# Altium footprint library Toi Library.PcbLib: 740 footprints (part 17 of 47)
Each footprint in its own frame and in the unit in brackets; x right, y up, seen from the top. Pads: shape width x height; smd on the part's side, far side on the other; paste and mask are expansions set on the pad; w line width, h text height; cw(c..) or ccw(c..) is an arc to the next point about the centre after c.
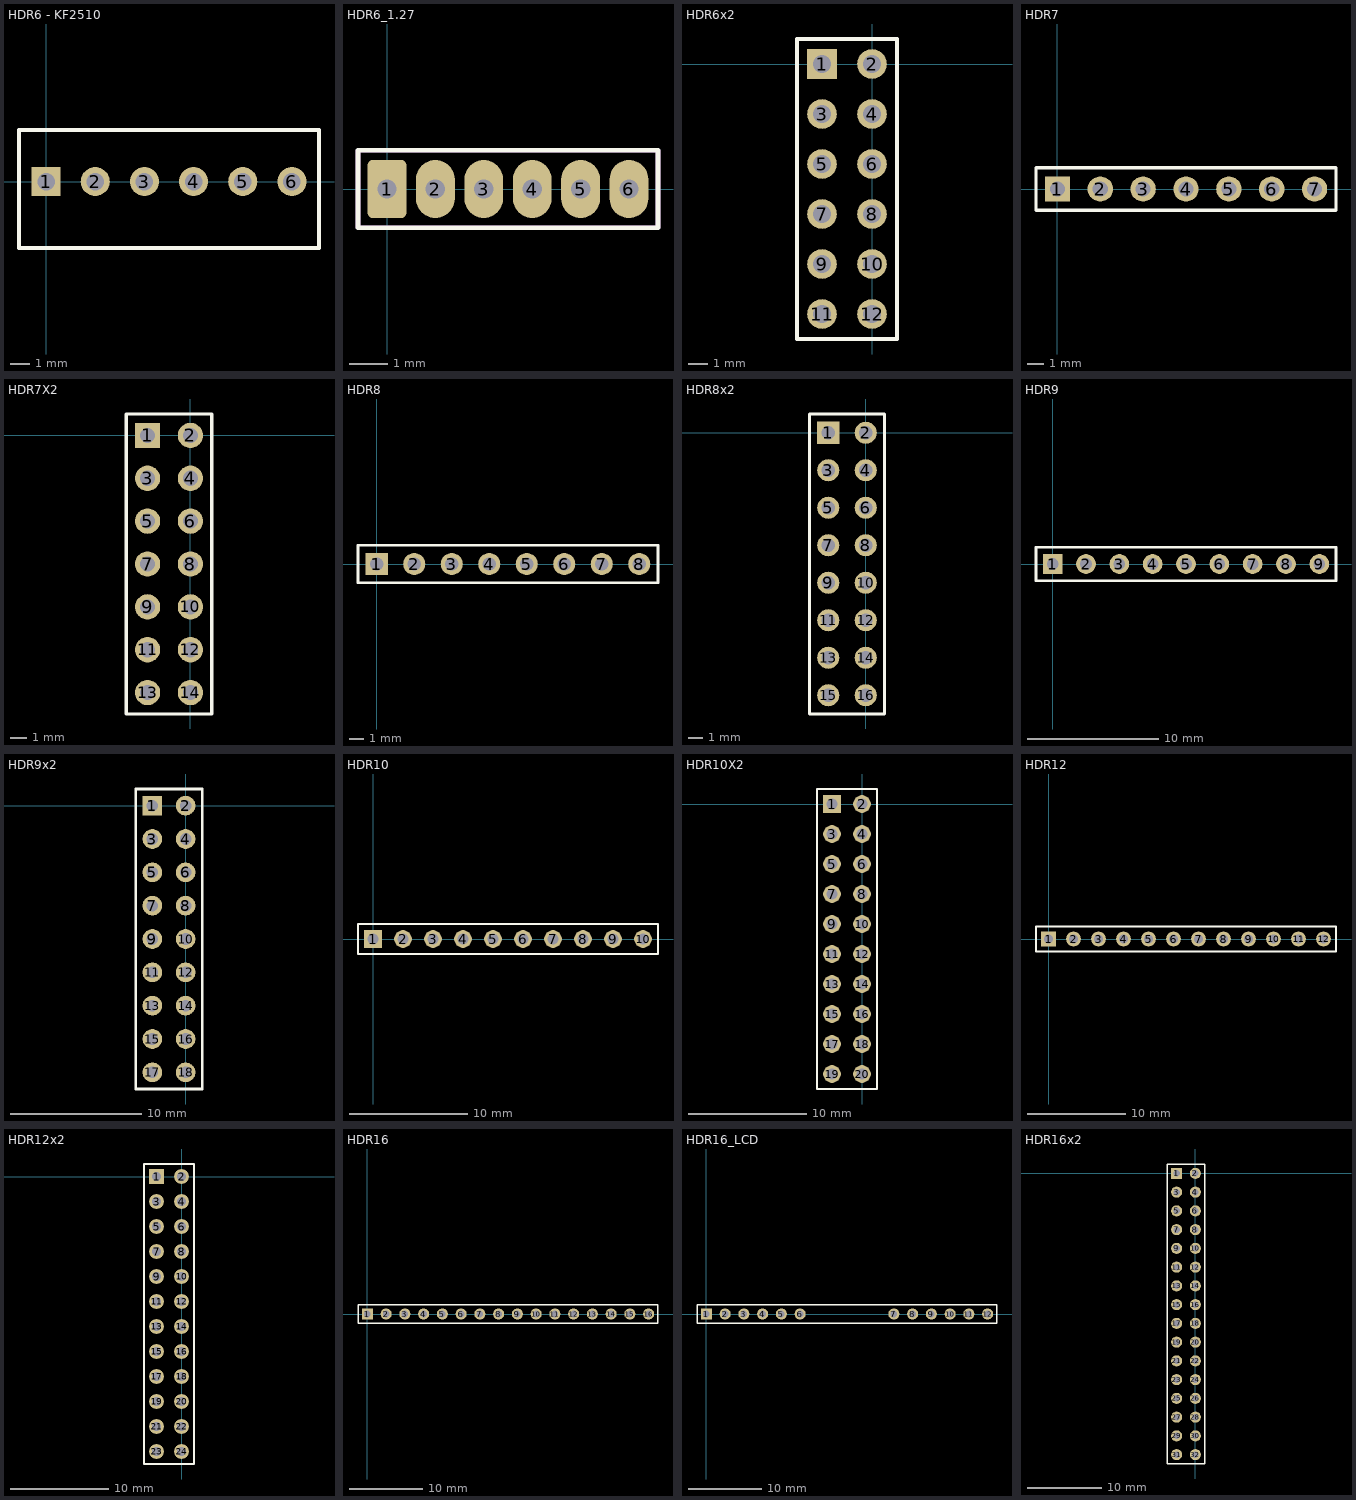
[diagram p16: the footprints below, top view; thin cyan lines are the x and y axes]

## HDR6 - KF2510 [mm] "Connector; Header; 6 Position"
height 1.14
pads (6):
  rect 1.5x1.5 hole 0.9: 1(0,0)
  round 1.5 hole 0.9: 2(2.54,0) 3(5.08,0) 4(7.62,0) 5(10.16,0) 6(12.7,0)
Top Overlay:
  lines w0.2: -1.397,-3.429 -1.397,2.667 14.097,2.667 14.097,-3.429 -1.397,-3.429
3D body "User Library-CI31_6.STEP": height 10.53, standoff -4.27, extent -1.27,-3.279 13.97,2.521

## HDR6_1.27 [mil] "Connector; Header; 6 Position, 0.050\" pitch"
pads (6):
  rrect25% 40x60 hole 20: 1(0,0)
  oval 40x60 hole 20: 2(50,0) 3(100,0) 4(150,0) 5(200,0) 6(250,0)
Top Overlay:
  lines w5: -30,-40 -30,40 280,40 280,-40 -30,-40
Bottom Solder:
  rectangle: 0,-30 250,30
Mechanical 13:
  lines w5: -30,-40 -30,40 280,40 280,-40 -30,-40

## HDR6x2 [mm] "Connector; Header; 3x2 Position"
height 1.14
pads (12):
  rect 1.5x1.5 hole 0.9: 1(-2.54,0)
  round 1.5 hole 0.9: 2(0,0) 3(-2.54,-2.54) 4(0,-2.54) 5(-2.54,-5.08) 6(0,-5.08) 7(-2.54,-7.62) 8(0,-7.62) 9(-2.54,-10.16) 10(0,-10.16) 11(-2.54,-12.7) 12(0,-12.7)
Top Overlay:
  lines w0.2: -3.81,-13.97 1.27,-13.97 1.27,1.27 -3.81,1.27 -3.81,-13.97
3D body "User Library-Header1x2.STEP": height 1.39, standoff -9.59, extent -3.81,-13.97 1.27,-11.43
3D body "User Library-Header1x2.STEP": height 1.39, standoff -9.59, extent -3.81,-8.89 1.27,-6.35
3D body "User Library-Header1x2.STEP": height 1.39, standoff -9.59, extent -3.81,-6.35 1.27,-3.81
3D body "User Library-Header1x2.STEP": height 1.39, standoff -9.59, extent -3.81,-3.81 1.27,-1.27
3D body "User Library-Header1x2.STEP": height 1.39, standoff -9.59, extent -3.81,-1.27 1.27,1.27
3D body "User Library-Header1x2.STEP": height 1.39, standoff -9.59, extent -3.81,-11.43 1.27,-8.89

## HDR7 [mm] "Connector; Header; 7 Position"
height 1.14
pads (7):
  rect 1.5x1.5 hole 0.9: 1(0,0)
  round 1.5 hole 0.9: 2(2.54,0) 3(5.08,0) 4(7.62,0) 5(10.16,0) 6(12.7,0) 7(15.24,0)
Top Overlay:
  lines w0.2: -1.27,-1.27 -1.27,1.27 16.51,1.27 16.51,-1.27 -1.27,-1.27
3D body "female_header_a-bl254-eg-g07d.stp": height 8.52, standoff -3.18, extent -1.42,-1.25 16.61,1.25

## HDR7X2 [mm]
pads (14):
  rect 1.5x1.5 hole 0.9: 1(-2.54,0)
  round 1.5 hole 0.9: 2(0,0) 3(-2.54,-2.54) 4(0,-2.54) 5(-2.54,-5.08) 6(0,-5.08) 7(-2.54,-7.62) 8(0,-7.62) 9(-2.54,-10.16) 10(0,-10.16) 11(-2.54,-12.7) 12(0,-12.7) 13(-2.54,-15.24) 14(0,-15.24)
Top Overlay:
  lines w0.2: -3.81,-16.51 1.27,-16.51 1.27,1.27 -3.81,1.27 -3.81,-16.51
3D body "User Library-Header1x2.STEP": height 1.39, standoff -9.59, extent -3.81,-13.97 1.27,-11.43
3D body "User Library-Header1x2.STEP": height 1.39, standoff -9.59, extent -3.81,-8.89 1.27,-6.35
3D body "User Library-Header1x2.STEP": height 1.39, standoff -9.59, extent -3.81,-6.35 1.27,-3.81
3D body "User Library-Header1x2.STEP": height 1.39, standoff -9.59, extent -3.81,-3.81 1.27,-1.27
3D body "User Library-Header1x2.STEP": height 1.39, standoff -9.59, extent -3.81,-1.27 1.27,1.27
3D body "User Library-Header1x2.STEP": height 1.39, standoff -9.59, extent -3.81,-11.43 1.27,-8.89
3D body "User Library-Header1x2.STEP": height 1.39, standoff -9.59, extent -3.81,-16.51 1.27,-13.97

## HDR8 [mm] "Connector; Header; 8 Position"
height 1.14
pads (8):
  rect 1.5x1.5 hole 0.9: 1(0,0)
  round 1.5 hole 0.9: 2(2.54,0) 3(5.08,0) 4(7.62,0) 5(10.16,0) 6(12.7,0) 7(15.24,0) 8(17.78,0)
Top Overlay:
  lines w0.2: -1.27,-1.27 19.05,-1.27 19.05,1.27 -1.27,1.27 -1.27,-1.27
3D body "female_header_a-bl254-eg-g08d.stp": height 7.92, standoff -3.78, extent -1.395,-1.257 19.175,1.243

## HDR8x2 [mm] "Connector; Header; 3x2 Position"
height 1.14
pads (16):
  rect 1.5x1.5 hole 0.9: 1(-2.54,0)
  round 1.5 hole 0.9: 2(0,0) 3(-2.54,-2.54) 4(0,-2.54) 5(-2.54,-5.08) 6(0,-5.08) 7(-2.54,-7.62) 8(0,-7.62) 9(-2.54,-10.16) 10(0,-10.16) 11(-2.54,-12.7) 12(0,-12.7) 13(-2.54,-15.24) 14(0,-15.24) 15(-2.54,-17.78) 16(0,-17.78)
Top Overlay:
  lines w0.2: -3.81,-19.05 1.27,-19.05 1.27,1.27 -3.81,1.27 -3.81,-19.05
3D body "User Library-Header1x2.STEP": height 1.39, standoff -9.59, extent -3.81,-19.05 1.27,-16.51
3D body "User Library-Header1x2.STEP": height 1.39, standoff -9.59, extent -3.81,-13.97 1.27,-11.43
3D body "User Library-Header1x2.STEP": height 1.39, standoff -9.59, extent -3.81,-8.89 1.27,-6.35
3D body "User Library-Header1x2.STEP": height 1.39, standoff -9.59, extent -3.81,-6.35 1.27,-3.81
3D body "User Library-Header1x2.STEP": height 1.39, standoff -9.59, extent -3.81,-3.81 1.27,-1.27
3D body "User Library-Header1x2.STEP": height 1.39, standoff -9.59, extent -3.81,-1.27 1.27,1.27
3D body "User Library-Header1x2.STEP": height 1.39, standoff -9.59, extent -3.81,-11.43 1.27,-8.89
3D body "User Library-Header1x2.STEP": height 1.39, standoff -9.59, extent -3.81,-16.51 1.27,-13.97

## HDR9 [mm] "Connector; Header; 9 Position"
height 1.14
pads (9):
  rect 1.5x1.5 hole 0.9: 1(0,0)
  round 1.5 hole 0.9: 2(2.54,0) 3(5.08,0) 4(7.62,0) 5(10.16,0) 6(12.7,0) 7(15.24,0) 8(17.78,0) 9(20.32,0)
Top Overlay:
  lines w0.2: -1.27,-1.27 -1.27,1.27 21.59,1.27 21.59,-1.27 -1.27,-1.27
3D body "female_header_a-bl254-eg-g09d.stp": height 7.92, standoff -3.78, extent -1.382,-1.255 21.728,1.245

## HDR9x2 [mm] "Connector; Header; 3x2 Position"
height 1.14
pads (18):
  rect 1.5x1.5 hole 0.9: 1(-2.54,0)
  round 1.5 hole 0.9: 2(0,0) 3(-2.54,-2.54) 4(0,-2.54) 5(-2.54,-5.08) 6(0,-5.08) 7(-2.54,-7.62) 8(0,-7.62) 9(-2.54,-10.16) 10(0,-10.16) 11(-2.54,-12.7) 12(0,-12.7) 13(-2.54,-15.24) 14(0,-15.24) 15(-2.54,-17.78) 16(0,-17.78) 17(-2.54,-20.32) 18(0,-20.32)
Top Overlay:
  lines w0.2: -3.81,-21.59 -3.81,1.27 1.27,1.27 1.27,-21.59 -3.81,-21.59
3D body "User Library-Header1x2.STEP": height 1.39, standoff -9.59, extent -3.81,-21.59 1.27,-19.05
3D body "User Library-Header1x2.STEP": height 1.39, standoff -9.59, extent -3.81,-16.51 1.27,-13.97
3D body "User Library-Header1x2.STEP": height 1.39, standoff -9.59, extent -3.81,-11.43 1.27,-8.89
3D body "User Library-Header1x2.STEP": height 1.39, standoff -9.59, extent -3.81,-1.27 1.27,1.27
3D body "User Library-Header1x2.STEP": height 1.39, standoff -9.59, extent -3.81,-3.81 1.27,-1.27
3D body "User Library-Header1x2.STEP": height 1.39, standoff -9.59, extent -3.81,-6.35 1.27,-3.81
3D body "User Library-Header1x2.STEP": height 1.39, standoff -9.59, extent -3.81,-8.89 1.27,-6.35
3D body "User Library-Header1x2.STEP": height 1.39, standoff -9.59, extent -3.81,-13.97 1.27,-11.43
3D body "User Library-Header1x2.STEP": height 1.39, standoff -9.59, extent -3.81,-19.05 1.27,-16.51

## HDR10 [mm] "Connector; Header; 10 Position"
height 1.14
pads (10):
  rect 1.5x1.5 hole 0.9: 1(0,0)
  round 1.5 hole 0.9: 2(2.54,0) 3(5.08,0) 4(7.62,0) 5(10.16,0) 6(12.7,0) 7(15.24,0) 8(17.78,0) 9(20.32,0) 10(22.86,0)
Top Overlay:
  lines w0.2: -1.27,-1.27 -1.27,1.27 0.635,1.27 24.13,1.27 24.13,-1.27 -1.27,-1.27
3D body "female_header_a-bl254-eg-g10d.stp": height 7.92, standoff -3.78, extent -1.408,-1.25 24.242,1.25

## HDR10X2 [mm] "Connector; Header; 10x2 Position"
pads (20):
  rect 1.5x1.5 hole 0.9: 1(-2.54,0)
  round 1.5 hole 0.9: 2(0,0) 3(-2.54,-2.54) 4(0,-2.54) 5(-2.54,-5.08) 6(0,-5.08) 7(-2.54,-7.62) 8(0,-7.62) 9(-2.54,-10.16) 10(0,-10.16) 11(-2.54,-12.7) 12(0,-12.7) 13(-2.54,-15.24) 14(0,-15.24) 15(-2.54,-17.78) 16(0,-17.78) 17(-2.54,-20.32) 18(0,-20.32) 19(-2.54,-22.86) 20(0,-22.86)
Top Overlay:
  lines w0.2: -3.81,-24.13 -3.81,1.27 1.27,1.27 1.27,-24.13 -3.81,-24.13
3D body "User Library-Header1x2.STEP": height 1.39, standoff -9.59, extent -3.81,-21.59 1.27,-19.05
3D body "User Library-Header1x2.STEP": height 1.39, standoff -9.59, extent -3.81,-16.51 1.27,-13.97
3D body "User Library-Header1x2.STEP": height 1.39, standoff -9.59, extent -3.81,-11.43 1.27,-8.89
3D body "User Library-Header1x2.STEP": height 1.39, standoff -9.59, extent -3.81,-1.27 1.27,1.27
3D body "User Library-Header1x2.STEP": height 1.39, standoff -9.59, extent -3.81,-3.81 1.27,-1.27
3D body "User Library-Header1x2.STEP": height 1.39, standoff -9.59, extent -3.81,-6.35 1.27,-3.81
3D body "User Library-Header1x2.STEP": height 1.39, standoff -9.59, extent -3.81,-8.89 1.27,-6.35
3D body "User Library-Header1x2.STEP": height 1.39, standoff -9.59, extent -3.81,-13.97 1.27,-11.43
3D body "User Library-Header1x2.STEP": height 1.39, standoff -9.59, extent -3.81,-19.05 1.27,-16.51
3D body "User Library-Header1x2.STEP": height 1.39, standoff -9.59, extent -3.81,-24.13 1.27,-21.59

## HDR12 [mm] "Connector; Header; 12 Position"
height 1.14
pads (12):
  rect 1.5x1.5 hole 0.9: 1(0,0)
  round 1.5 hole 0.9: 2(2.54,0) 3(5.08,0) 4(7.62,0) 5(10.16,0) 6(12.7,0) 7(15.24,0) 8(17.78,0) 9(20.32,0) 10(22.86,0) 11(25.4,0) 12(27.94,0)
Top Overlay:
  lines w0.2: -1.27,-1.27 29.21,-1.27 29.21,1.27 0.635,1.27 -1.27,1.27 -1.27,-1.27
3D body "female_header_a-bl254-eg-g12d.stp": height 8.52, standoff -3.18, extent -1.382,-1.255 29.348,1.245

## HDR12x2 [mm] "Connector; Header; 3x2 Position"
height 1.14
pads (24):
  rect 1.5x1.5 hole 0.9: 1(-2.54,0)
  round 1.5 hole 0.9: 2(0,0) 3(-2.54,-2.54) 4(0,-2.54) 5(-2.54,-5.08) 6(0,-5.08) 7(-2.54,-7.62) 8(0,-7.62) 9(-2.54,-10.16) 10(0,-10.16) 11(-2.54,-12.7) 12(0,-12.7) 13(-2.54,-15.24) 14(0,-15.24) 15(-2.54,-17.78) 16(0,-17.78) 17(-2.54,-20.32) 18(0,-20.32) 19(-2.54,-22.86) 20(0,-22.86) 21(-2.54,-25.4) 22(0,-25.4) 23(-2.54,-27.94) 24(0,-27.94)
Top Overlay:
  lines w0.2: -3.81,-29.21 -3.81,1.27 1.27,1.27 1.27,-29.21 -3.81,-29.21
3D body "User Library-Header1x2.STEP": height 1.39, standoff -9.59, extent -3.81,-21.59 1.27,-19.05
3D body "User Library-Header1x2.STEP": height 1.39, standoff -9.59, extent -3.81,-16.51 1.27,-13.97
3D body "User Library-Header1x2.STEP": height 1.39, standoff -9.59, extent -3.81,-11.43 1.27,-8.89
3D body "User Library-Header1x2.STEP": height 1.39, standoff -9.59, extent -3.81,-1.27 1.27,1.27
3D body "User Library-Header1x2.STEP": height 1.39, standoff -9.59, extent -3.81,-3.81 1.27,-1.27
3D body "User Library-Header1x2.STEP": height 1.39, standoff -9.59, extent -3.81,-6.35 1.27,-3.81
3D body "User Library-Header1x2.STEP": height 1.39, standoff -9.59, extent -3.81,-8.89 1.27,-6.35
3D body "User Library-Header1x2.STEP": height 1.39, standoff -9.59, extent -3.81,-13.97 1.27,-11.43
3D body "User Library-Header1x2.STEP": height 1.39, standoff -9.59, extent -3.81,-19.05 1.27,-16.51
3D body "User Library-Header1x2.STEP": height 1.39, standoff -9.59, extent -3.81,-24.13 1.27,-21.59
3D body "User Library-Header1x2.STEP": height 1.39, standoff -9.59, extent -3.81,-26.67 1.27,-24.13
3D body "User Library-Header1x2.STEP": height 1.39, standoff -9.59, extent -3.81,-29.21 1.27,-26.67

## HDR16 [mm] "Connector; Header; 16 Position"
height 1.14
pads (16):
  rect 1.5x1.5 hole 0.9: 1(0,0)
  round 1.5 hole 0.9: 2(2.54,0) 3(5.08,0) 4(7.62,0) 5(10.16,0) 6(12.7,0) 7(15.24,0) 8(17.78,0) 9(20.32,0) 10(22.86,0) 11(25.4,0) 12(27.94,0) 13(30.48,0) 14(33.02,0) 15(35.56,0) 16(38.1,0)
Top Overlay:
  lines w0.2: -1.27,-1.27 39.37,-1.27 39.37,1.27 0.635,1.27 -1.27,1.27 -1.27,-1.27
3D body "female_header_a-bl254-eg-g16d.stp": height 7.92, standoff -3.78, extent -1.408,-1.255 39.482,1.245

## HDR16_LCD [mm] "Connector; Header; 16 Position"
height 1.14
pads (12):
  rect 1.5x1.5 hole 0.9: 1(0,0)
  round 1.5 hole 0.9: 2(2.54,0) 3(5.08,0) 4(7.62,0) 5(10.16,0) 6(12.7,0) 7(25.4,0) 8(27.94,0) 9(30.48,0) 10(33.02,0) 11(35.56,0) 12(38.1,0)
Top Overlay:
  lines w0.2: -1.27,-1.27 39.37,-1.27 39.37,1.27 0.635,1.27 -1.27,1.27 -1.27,-1.27
3D body "female_header_a-bl254-eg-g16d.stp": height 7.92, standoff -3.78, extent -1.408,-1.255 39.482,1.245

## HDR16x2 [mm] "Connector; Header; 3x2 Position"
height 1.14
pads (32):
  rect 1.5x1.5 hole 0.9: 1(-2.54,0)
  round 1.5 hole 0.9: 2(0,0) 3(-2.54,-2.54) 4(0,-2.54) 5(-2.54,-5.08) 6(0,-5.08) 7(-2.54,-7.62) 8(0,-7.62) 9(-2.54,-10.16) 10(0,-10.16) 11(-2.54,-12.7) 12(0,-12.7) 13(-2.54,-15.24) 14(0,-15.24) 15(-2.54,-17.78) 16(0,-17.78) 17(-2.54,-20.32) 18(0,-20.32) 19(-2.54,-22.86) 20(0,-22.86) 21(-2.54,-25.4) 22(0,-25.4) 23(-2.54,-27.94) 24(0,-27.94) 25(-2.54,-30.48) 26(0,-30.48) 27(-2.54,-33.02) 28(0,-33.02) 29(-2.54,-35.56) 30(0,-35.56) 31(-2.54,-38.1) 32(0,-38.1)
Top Overlay:
  lines w0.2: -3.81,-39.37 -3.81,1.27 1.27,1.27 1.27,-39.37 -3.81,-39.37
3D body "User Library-Header1x2.STEP": height 1.39, standoff -9.59, extent -3.81,-39.37 1.27,-36.83
3D body "User Library-Header1x2.STEP": height 1.39, standoff -9.59, extent -3.81,-36.83 1.27,-34.29
3D body "User Library-Header1x2.STEP": height 1.39, standoff -9.59, extent -3.81,-34.29 1.27,-31.75
3D body "User Library-Header1x2.STEP": height 1.39, standoff -9.59, extent -3.81,-31.75 1.27,-29.21
3D body "User Library-Header1x2.STEP": height 1.39, standoff -9.59, extent -3.81,-21.59 1.27,-19.05
3D body "User Library-Header1x2.STEP": height 1.39, standoff -9.59, extent -3.81,-16.51 1.27,-13.97
3D body "User Library-Header1x2.STEP": height 1.39, standoff -9.59, extent -3.81,-11.43 1.27,-8.89
3D body "User Library-Header1x2.STEP": height 1.39, standoff -9.59, extent -3.81,-1.27 1.27,1.27
3D body "User Library-Header1x2.STEP": height 1.39, standoff -9.59, extent -3.81,-3.81 1.27,-1.27
3D body "User Library-Header1x2.STEP": height 1.39, standoff -9.59, extent -3.81,-6.35 1.27,-3.81
3D body "User Library-Header1x2.STEP": height 1.39, standoff -9.59, extent -3.81,-8.89 1.27,-6.35
3D body "User Library-Header1x2.STEP": height 1.39, standoff -9.59, extent -3.81,-13.97 1.27,-11.43
3D body "User Library-Header1x2.STEP": height 1.39, standoff -9.59, extent -3.81,-19.05 1.27,-16.51
3D body "User Library-Header1x2.STEP": height 1.39, standoff -9.59, extent -3.81,-24.13 1.27,-21.59
3D body "User Library-Header1x2.STEP": height 1.39, standoff -9.59, extent -3.81,-26.67 1.27,-24.13
3D body "User Library-Header1x2.STEP": height 1.39, standoff -9.59, extent -3.81,-29.21 1.27,-26.67